# Altium schematic symbol library jlcpcb_2025_04_resistors_extended_2010.schlib: 1697 symbols (part 5 of 9) (continued)
## FRC2010F3R90TS
designator R?  Resistance: 3.9Ω  (hidden comment: *)
Resistor, 3.9Ω, ±1%, 750mW, 200V, ±200ppm/℃, SMD 2010; Manufacturer: Uniroyal; Manufacturer Part Number: FRC2010F3R90TS; Supplier 1: LCSC; Supplier Part Number 1: C3013307; JLCPCB Part Number: C3013307; Power Rating: 750mW; Category: Resistors; Package Size: 2010; JLCPCB Basic Part: Yes; Tolerance: ±1%; Voltage Rating: 200V; Temperature Coefficient: ±200ppm/℃; ComponentLink1Description: Datasheet; ComponentLink1URL: https://wmsc.lcsc.com/wmsc/upload/file/pdf/v2/lcsc/2308241947_FOJAN-FRC2010F3R90TS_C3013307.pdf; ComponentLink2Description: JLCPCB Part URL; ComponentLink2URL: https://jlcpcb.com/partdetail/C3013307
pins: 1, 2
1 alternate drawing of the same symbol

## FRC2010F5R10TS
designator R?  Resistance: 5.1Ω  (hidden comment: *)
Resistor, 5.1Ω, ±1%, SMD 2010; Manufacturer: Uniroyal; Manufacturer Part Number: FRC2010F5R10TS; Supplier 1: LCSC; Supplier Part Number 1: C5121559; JLCPCB Part Number: C5121559; Category: Resistors; Package Size: 2010; JLCPCB Basic Part: Yes; Tolerance: ±1%; ComponentLink1Description: Datasheet; ComponentLink1URL: https://wmsc.lcsc.com/wmsc/upload/file/pdf/v2/lcsc/2308241947_FOJAN-FRC2010F5R10TS_C5121559.pdf; ComponentLink2Description: JLCPCB Part URL; ComponentLink2URL: https://jlcpcb.com/partdetail/C5121559
pins: 1, 2
1 alternate drawing of the same symbol

## FRC2010F5R60TS
designator R?  Resistance: 5.6Ω  (hidden comment: *)
Resistor, 5.6Ω, ±1%, 750mW, 200V, ±200ppm/℃, SMD 2010; Manufacturer: Uniroyal; Manufacturer Part Number: FRC2010F5R60TS; Supplier 1: LCSC; Supplier Part Number 1: C3000667; JLCPCB Part Number: C3000667; Power Rating: 750mW; Category: Resistors; Package Size: 2010; JLCPCB Basic Part: Yes; Tolerance: ±1%; Voltage Rating: 200V; Temperature Coefficient: ±200ppm/℃; ComponentLink1Description: Datasheet; ComponentLink1URL: https://wmsc.lcsc.com/wmsc/upload/file/pdf/v2/lcsc/2308241947_FOJAN-FRC2010F5R60TS_C3000667.pdf; ComponentLink2Description: JLCPCB Part URL; ComponentLink2URL: https://jlcpcb.com/partdetail/C3000667
pins: 1, 2
1 alternate drawing of the same symbol

## FRC2010F7R50TS
designator R?  Resistance: 7.5Ω  (hidden comment: *)
Resistor, 7.5Ω, ±1%, 750mW, 200V, ±200ppm/℃, SMD 2010; Manufacturer: Uniroyal; Manufacturer Part Number: FRC2010F7R50TS; Supplier 1: LCSC; Supplier Part Number 1: C3000555; JLCPCB Part Number: C3000555; Power Rating: 750mW; Category: Resistors; Package Size: 2010; JLCPCB Basic Part: Yes; Tolerance: ±1%; Voltage Rating: 200V; Temperature Coefficient: ±200ppm/℃; ComponentLink1Description: Datasheet; ComponentLink1URL: https://wmsc.lcsc.com/wmsc/upload/file/pdf/v2/lcsc/2308241947_FOJAN-FRC2010F7R50TS_C3000555.pdf; ComponentLink2Description: JLCPCB Part URL; ComponentLink2URL: https://jlcpcb.com/partdetail/C3000555
pins: 1, 2
1 alternate drawing of the same symbol

## FRC2010F10R0TS
designator R?  Resistance: 10Ω  (hidden comment: *)
Resistor, 10Ω, ±1%, 750mW, 200V, ±200ppm/℃, SMD 2010; Manufacturer: Uniroyal; Manufacturer Part Number: FRC2010F10R0TS; Supplier 1: LCSC; Supplier Part Number 1: C2999588; JLCPCB Part Number: C2999588; Power Rating: 750mW; Category: Resistors; Package Size: 2010; JLCPCB Basic Part: Yes; Tolerance: ±1%; Voltage Rating: 200V; Temperature Coefficient: ±200ppm/℃; ComponentLink1Description: Datasheet; ComponentLink1URL: https://wmsc.lcsc.com/wmsc/upload/file/pdf/v2/lcsc/2308241947_FOJAN-FRC2010F10R0TS_C2999588.pdf; ComponentLink2Description: JLCPCB Part URL; ComponentLink2URL: https://jlcpcb.com/partdetail/C2999588
pins: 1, 2
1 alternate drawing of the same symbol

## FRC2010F12R0TS
designator R?  Resistance: 12Ω  (hidden comment: *)
Resistor, 12Ω, ±1%, 750mW, 200V, ±100ppm/℃, SMD 2010; Manufacturer: Uniroyal; Manufacturer Part Number: FRC2010F12R0TS; Supplier 1: LCSC; Supplier Part Number 1: C3013299; JLCPCB Part Number: C3013299; Power Rating: 750mW; Category: Resistors; Package Size: 2010; JLCPCB Basic Part: Yes; Tolerance: ±1%; Voltage Rating: 200V; Temperature Coefficient: ±100ppm/℃; ComponentLink1Description: Datasheet; ComponentLink1URL: https://wmsc.lcsc.com/wmsc/upload/file/pdf/v2/lcsc/2308241947_FOJAN-FRC2010F12R0TS_C3013299.pdf; ComponentLink2Description: JLCPCB Part URL; ComponentLink2URL: https://jlcpcb.com/partdetail/C3013299
pins: 1, 2
1 alternate drawing of the same symbol

## FRC2010F13R0TS
designator R?  Resistance: 13Ω  (hidden comment: *)
Resistor, 13Ω, ±1%, 750mW, 200V, ±100ppm/℃, -55℃~+155℃, SMD 2010; Manufacturer: Uniroyal; Manufacturer Part Number: FRC2010F13R0TS; Supplier 1: LCSC; Supplier Part Number 1: C2974090; JLCPCB Part Number: C2974090; Power Rating: 750mW; Category: Resistors; Package Size: 2010; JLCPCB Basic Part: Yes; Tolerance: ±1%; Voltage Rating: 200V; Temperature Coefficient: ±100ppm/℃; Temperature Rating: -55℃~+155℃; ComponentLink1Description: Datasheet; ComponentLink1URL: https://wmsc.lcsc.com/wmsc/upload/file/pdf/v2/lcsc/2202151130_FOJAN-FRC2010F13R0TS_C2974090.pdf; ComponentLink2Description: JLCPCB Part URL; ComponentLink2URL: https://jlcpcb.com/partdetail/C2974090
pins: 1, 2
1 alternate drawing of the same symbol

## FRC2010F15R0TS
designator R?  Resistance: 15Ω  (hidden comment: *)
Resistor, 15Ω, ±1%, 750mW, 200V, ±100ppm/℃, SMD 2010; Manufacturer: Uniroyal; Manufacturer Part Number: FRC2010F15R0TS; Supplier 1: LCSC; Supplier Part Number 1: C3013300; JLCPCB Part Number: C3013300; Power Rating: 750mW; Category: Resistors; Package Size: 2010; JLCPCB Basic Part: Yes; Tolerance: ±1%; Voltage Rating: 200V; Temperature Coefficient: ±100ppm/℃; ComponentLink1Description: Datasheet; ComponentLink1URL: https://wmsc.lcsc.com/wmsc/upload/file/pdf/v2/lcsc/2308241947_FOJAN-FRC2010F15R0TS_C3013300.pdf; ComponentLink2Description: JLCPCB Part URL; ComponentLink2URL: https://jlcpcb.com/partdetail/C3013300
pins: 1, 2
1 alternate drawing of the same symbol

## FRC2010F22R0TS
designator R?  Resistance: 22Ω  (hidden comment: *)
Resistor, 22Ω, ±1%, 750mW, 200V, ±100ppm/℃, -55℃~+155℃, SMD 2010; Manufacturer: Uniroyal; Manufacturer Part Number: FRC2010F22R0TS; Supplier 1: LCSC; Supplier Part Number 1: C2933985; JLCPCB Part Number: C2933985; Power Rating: 750mW; Category: Resistors; Package Size: 2010; JLCPCB Basic Part: Yes; Tolerance: ±1%; Voltage Rating: 200V; Temperature Coefficient: ±100ppm/℃; Temperature Rating: -55℃~+155℃; ComponentLink1Description: Datasheet; ComponentLink1URL: https://wmsc.lcsc.com/wmsc/upload/file/pdf/v2/lcsc/2308241947_FOJAN-FRC2010F22R0TS_C2933985.pdf; ComponentLink2Description: JLCPCB Part URL; ComponentLink2URL: https://jlcpcb.com/partdetail/C2933985
pins: 1, 2
1 alternate drawing of the same symbol

## FRC2010F33R0TS
designator R?  Resistance: 33Ω  (hidden comment: *)
Resistor, 33Ω, ±1%, 750mW, 200V, ±100ppm/℃, SMD 2010; Manufacturer: Uniroyal; Manufacturer Part Number: FRC2010F33R0TS; Supplier 1: LCSC; Supplier Part Number 1: C3000763; JLCPCB Part Number: C3000763; Power Rating: 750mW; Category: Resistors; Package Size: 2010; JLCPCB Basic Part: Yes; Tolerance: ±1%; Voltage Rating: 200V; Temperature Coefficient: ±100ppm/℃; ComponentLink1Description: Datasheet; ComponentLink1URL: https://wmsc.lcsc.com/wmsc/upload/file/pdf/v2/lcsc/2308241947_FOJAN-FRC2010F33R0TS_C3000763.pdf; ComponentLink2Description: JLCPCB Part URL; ComponentLink2URL: https://jlcpcb.com/partdetail/C3000763
pins: 1, 2
1 alternate drawing of the same symbol

## FRC2010F36R0TS
designator R?  Resistance: 36Ω  (hidden comment: *)
Resistor, 36Ω, ±1%, 750mW, 200V, ±100ppm/℃, -55℃~+155℃, SMD 2010; Manufacturer: Uniroyal; Manufacturer Part Number: FRC2010F36R0TS; Supplier 1: LCSC; Supplier Part Number 1: C2960735; JLCPCB Part Number: C2960735; Power Rating: 750mW; Category: Resistors; Package Size: 2010; JLCPCB Basic Part: Yes; Tolerance: ±1%; Voltage Rating: 200V; Temperature Coefficient: ±100ppm/℃; Temperature Rating: -55℃~+155℃; ComponentLink1Description: Datasheet; ComponentLink1URL: https://wmsc.lcsc.com/wmsc/upload/file/pdf/v2/lcsc/2308241947_FOJAN-FRC2010F36R0TS_C2960735.pdf; ComponentLink2Description: JLCPCB Part URL; ComponentLink2URL: https://jlcpcb.com/partdetail/C2960735
pins: 1, 2
1 alternate drawing of the same symbol

## FRC2010F39R0TS
designator R?  Resistance: 39Ω  (hidden comment: *)
Resistor, 39Ω, ±1%, 750mW, 200V, ±100ppm/℃, SMD 2010; Manufacturer: Uniroyal; Manufacturer Part Number: FRC2010F39R0TS; Supplier 1: LCSC; Supplier Part Number 1: C3013306; JLCPCB Part Number: C3013306; Power Rating: 750mW; Category: Resistors; Package Size: 2010; JLCPCB Basic Part: Yes; Tolerance: ±1%; Voltage Rating: 200V; Temperature Coefficient: ±100ppm/℃; ComponentLink1Description: Datasheet; ComponentLink1URL: https://wmsc.lcsc.com/wmsc/upload/file/pdf/v2/lcsc/2308241947_FOJAN-FRC2010F39R0TS_C3013306.pdf; ComponentLink2Description: JLCPCB Part URL; ComponentLink2URL: https://jlcpcb.com/partdetail/C3013306
pins: 1, 2
1 alternate drawing of the same symbol

## FRC2010F41R2TS
designator R?  Resistance: 41.2Ω  (hidden comment: *)
Resistor, 41.2Ω, ±1%, 750mW, 200V, ±100ppm/℃, SMD 2010; Manufacturer: Uniroyal; Manufacturer Part Number: FRC2010F41R2TS; Supplier 1: LCSC; Supplier Part Number 1: C3013308; JLCPCB Part Number: C3013308; Power Rating: 750mW; Category: Resistors; Package Size: 2010; JLCPCB Basic Part: Yes; Tolerance: ±1%; Voltage Rating: 200V; Temperature Coefficient: ±100ppm/℃; ComponentLink1Description: Datasheet; ComponentLink1URL: https://wmsc.lcsc.com/wmsc/upload/file/pdf/v2/lcsc/2308241947_FOJAN-FRC2010F41R2TS_C3013308.pdf; ComponentLink2Description: JLCPCB Part URL; ComponentLink2URL: https://jlcpcb.com/partdetail/C3013308
pins: 1, 2
1 alternate drawing of the same symbol

## FRC2010F51R0TS
designator R?  Resistance: 51Ω  (hidden comment: *)
Resistor, 51Ω, ±1%, 750mW, 200V, ±100ppm/℃, SMD 2010; Manufacturer: Uniroyal; Manufacturer Part Number: FRC2010F51R0TS; Supplier 1: LCSC; Supplier Part Number 1: C3000766; JLCPCB Part Number: C3000766; Power Rating: 750mW; Category: Resistors; Package Size: 2010; JLCPCB Basic Part: Yes; Tolerance: ±1%; Voltage Rating: 200V; Temperature Coefficient: ±100ppm/℃; ComponentLink1Description: Datasheet; ComponentLink1URL: https://wmsc.lcsc.com/wmsc/upload/file/pdf/v2/lcsc/2308241947_FOJAN-FRC2010F51R0TS_C3000766.pdf; ComponentLink2Description: JLCPCB Part URL; ComponentLink2URL: https://jlcpcb.com/partdetail/C3000766
pins: 1, 2
1 alternate drawing of the same symbol

## FRC2010F62R0TS
designator R?  Resistance: 62Ω  (hidden comment: *)
Resistor, 62Ω, ±1%, 750mW, 200V, ±100ppm/℃, -55℃~+155℃, SMD 2010; Manufacturer: Uniroyal; Manufacturer Part Number: FRC2010F62R0TS; Supplier 1: LCSC; Supplier Part Number 1: C2933990; JLCPCB Part Number: C2933990; Power Rating: 750mW; Category: Resistors; Package Size: 2010; JLCPCB Basic Part: Yes; Tolerance: ±1%; Voltage Rating: 200V; Temperature Coefficient: ±100ppm/℃; Temperature Rating: -55℃~+155℃; ComponentLink1Description: Datasheet; ComponentLink1URL: https://wmsc.lcsc.com/wmsc/upload/file/pdf/v2/lcsc/2308241947_FOJAN-FRC2010F62R0TS_C2933990.pdf; ComponentLink2Description: JLCPCB Part URL; ComponentLink2URL: https://jlcpcb.com/partdetail/C2933990
pins: 1, 2
1 alternate drawing of the same symbol

## FRC2010F63R4TS
designator R?  Resistance: 63.4Ω  (hidden comment: *)
Resistor, 63.4Ω, ±1%, 750mW, 200V, ±100ppm/℃, -55℃~+155℃, SMD 2010; Manufacturer: Uniroyal; Manufacturer Part Number: FRC2010F63R4TS; Supplier 1: LCSC; Supplier Part Number 1: C2933991; JLCPCB Part Number: C2933991; Power Rating: 750mW; Category: Resistors; Package Size: 2010; JLCPCB Basic Part: Yes; Tolerance: ±1%; Voltage Rating: 200V; Temperature Coefficient: ±100ppm/℃; Temperature Rating: -55℃~+155℃; ComponentLink1Description: Datasheet; ComponentLink1URL: https://wmsc.lcsc.com/wmsc/upload/file/pdf/v2/lcsc/2308241947_FOJAN-FRC2010F63R4TS_C2933991.pdf; ComponentLink2Description: JLCPCB Part URL; ComponentLink2URL: https://jlcpcb.com/partdetail/C2933991
pins: 1, 2
1 alternate drawing of the same symbol

## FRC2010F75R0TS
designator R?  Resistance: 75Ω  (hidden comment: *)
Resistor, 75Ω, ±1%, 750mW, 200V, ±100ppm/℃, -55℃~+155℃, SMD 2010; Manufacturer: Uniroyal; Manufacturer Part Number: FRC2010F75R0TS; Supplier 1: LCSC; Supplier Part Number 1: C2933992; JLCPCB Part Number: C2933992; Power Rating: 750mW; Category: Resistors; Package Size: 2010; JLCPCB Basic Part: Yes; Tolerance: ±1%; Voltage Rating: 200V; Temperature Coefficient: ±100ppm/℃; Temperature Rating: -55℃~+155℃; ComponentLink1Description: Datasheet; ComponentLink1URL: https://wmsc.lcsc.com/wmsc/upload/file/pdf/v2/lcsc/2308241947_FOJAN-FRC2010F75R0TS_C2933992.pdf; ComponentLink2Description: JLCPCB Part URL; ComponentLink2URL: https://jlcpcb.com/partdetail/C2933992
pins: 1, 2
1 alternate drawing of the same symbol

## FRC2010F1000TS
designator R?  Resistance: 100Ω  (hidden comment: *)
Resistor, 100Ω, ±1%, 750mW, 200V, ±100ppm/℃, -55℃~+155℃, SMD 2010; Manufacturer: Uniroyal; Manufacturer Part Number: FRC2010F1000TS; Supplier 1: LCSC; Supplier Part Number 1: C2974086; JLCPCB Part Number: C2974086; Power Rating: 750mW; Category: Resistors; Package Size: 2010; JLCPCB Basic Part: Yes; Tolerance: ±1%; Voltage Rating: 200V; Temperature Coefficient: ±100ppm/℃; Temperature Rating: -55℃~+155℃; ComponentLink1Description: Datasheet; ComponentLink1URL: https://wmsc.lcsc.com/wmsc/upload/file/pdf/v2/lcsc/2202151130_FOJAN-FRC2010F1000TS_C2974086.pdf; ComponentLink2Description: JLCPCB Part URL; ComponentLink2URL: https://jlcpcb.com/partdetail/C2974086
pins: 1, 2
1 alternate drawing of the same symbol

## FRC2010F1001TS
designator R?  Resistance: 1kΩ  (hidden comment: *)
Resistor, 1kΩ, ±1%, 750mW, 200V, ±100ppm/℃, -55℃~+155℃, SMD 2010; Manufacturer: Uniroyal; Manufacturer Part Number: FRC2010F1001TS; Supplier 1: LCSC; Supplier Part Number 1: C2974087; JLCPCB Part Number: C2974087; Power Rating: 750mW; Category: Resistors; Package Size: 2010; JLCPCB Basic Part: Yes; Tolerance: ±1%; Voltage Rating: 200V; Temperature Coefficient: ±100ppm/℃; Temperature Rating: -55℃~+155℃; ComponentLink1Description: Datasheet; ComponentLink1URL: https://wmsc.lcsc.com/wmsc/upload/file/pdf/v2/lcsc/2202151130_FOJAN-FRC2010F1001TS_C2974087.pdf; ComponentLink2Description: JLCPCB Part URL; ComponentLink2URL: https://jlcpcb.com/partdetail/C2974087
pins: 1, 2
1 alternate drawing of the same symbol

## FRC2010F1002TS
designator R?  Resistance: 10kΩ  (hidden comment: *)
Resistor, 10kΩ, ±1%, 750mW, 200V, ±100ppm/℃, -55℃~+155℃, SMD 2010; Manufacturer: Uniroyal; Manufacturer Part Number: FRC2010F1002TS; Supplier 1: LCSC; Supplier Part Number 1: C2960917; JLCPCB Part Number: C2960917; Power Rating: 750mW; Category: Resistors; Package Size: 2010; JLCPCB Basic Part: Yes; Tolerance: ±1%; Voltage Rating: 200V; Temperature Coefficient: ±100ppm/℃; Temperature Rating: -55℃~+155℃; ComponentLink1Description: Datasheet; ComponentLink1URL: https://wmsc.lcsc.com/wmsc/upload/file/pdf/v2/lcsc/2308241947_FOJAN-FRC2010F1002TS_C2960917.pdf; ComponentLink2Description: JLCPCB Part URL; ComponentLink2URL: https://jlcpcb.com/partdetail/C2960917
pins: 1, 2
1 alternate drawing of the same symbol

## FRC2010F1003TS
designator R?  Resistance: 100kΩ  (hidden comment: *)
Resistor, 100kΩ, ±1%, 750mW, 200V, ±100ppm/℃, -55℃~+155℃, SMD 2010; Manufacturer: Uniroyal; Manufacturer Part Number: FRC2010F1003TS; Supplier 1: LCSC; Supplier Part Number 1: C2974088; JLCPCB Part Number: C2974088; Power Rating: 750mW; Category: Resistors; Package Size: 2010; JLCPCB Basic Part: Yes; Tolerance: ±1%; Voltage Rating: 200V; Temperature Coefficient: ±100ppm/℃; Temperature Rating: -55℃~+155℃; ComponentLink1Description: Datasheet; ComponentLink1URL: https://wmsc.lcsc.com/wmsc/upload/file/pdf/v2/lcsc/2202151130_FOJAN-FRC2010F1003TS_C2974088.pdf; ComponentLink2Description: JLCPCB Part URL; ComponentLink2URL: https://jlcpcb.com/partdetail/C2974088
pins: 1, 2
1 alternate drawing of the same symbol

## FRC2010F1004TS
designator R?  Resistance: 1MΩ  (hidden comment: *)
Resistor, 1MΩ, ±1%, 750mW, 200V, ±100ppm/℃, -55℃~+155℃, SMD 2010; Manufacturer: Uniroyal; Manufacturer Part Number: FRC2010F1004TS; Supplier 1: LCSC; Supplier Part Number 1: C2933978; JLCPCB Part Number: C2933978; Power Rating: 750mW; Category: Resistors; Package Size: 2010; JLCPCB Basic Part: Yes; Tolerance: ±1%; Voltage Rating: 200V; Temperature Coefficient: ±100ppm/℃; Temperature Rating: -55℃~+155℃; ComponentLink1Description: Datasheet; ComponentLink1URL: https://wmsc.lcsc.com/wmsc/upload/file/pdf/v2/lcsc/2308241947_FOJAN-FRC2010F1004TS_C2933978.pdf; ComponentLink2Description: JLCPCB Part URL; ComponentLink2URL: https://jlcpcb.com/partdetail/C2933978
pins: 1, 2
1 alternate drawing of the same symbol

## FRC2010F1100TS
designator R?  Resistance: 110Ω  (hidden comment: *)
Resistor, 110Ω, ±1%, 750mW, 200V, ±100ppm/℃, -55℃~+155℃, SMD 2010; Manufacturer: Uniroyal; Manufacturer Part Number: FRC2010F1100TS; Supplier 1: LCSC; Supplier Part Number 1: C2960847; JLCPCB Part Number: C2960847; Power Rating: 750mW; Category: Resistors; Package Size: 2010; JLCPCB Basic Part: Yes; Tolerance: ±1%; Voltage Rating: 200V; Temperature Coefficient: ±100ppm/℃; Temperature Rating: -55℃~+155℃; ComponentLink1Description: Datasheet; ComponentLink1URL: https://wmsc.lcsc.com/wmsc/upload/file/pdf/v2/lcsc/2308241947_FOJAN-FRC2010F1100TS_C2960847.pdf; ComponentLink2Description: JLCPCB Part URL; ComponentLink2URL: https://jlcpcb.com/partdetail/C2960847
pins: 1, 2
1 alternate drawing of the same symbol

## FRC2010F1200TS
designator R?  Resistance: 120Ω  (hidden comment: *)
Resistor, 120Ω, ±1%, 750mW, 200V, ±100ppm/℃, -55℃~+155℃, SMD 2010; Manufacturer: Uniroyal; Manufacturer Part Number: FRC2010F1200TS; Supplier 1: LCSC; Supplier Part Number 1: C2974089; JLCPCB Part Number: C2974089; Power Rating: 750mW; Category: Resistors; Package Size: 2010; JLCPCB Basic Part: Yes; Tolerance: ±1%; Voltage Rating: 200V; Temperature Coefficient: ±100ppm/℃; Temperature Rating: -55℃~+155℃; ComponentLink1Description: Datasheet; ComponentLink1URL: https://wmsc.lcsc.com/wmsc/upload/file/pdf/v2/lcsc/2202151130_FOJAN-FRC2010F1200TS_C2974089.pdf; ComponentLink2Description: JLCPCB Part URL; ComponentLink2URL: https://jlcpcb.com/partdetail/C2974089
pins: 1, 2
1 alternate drawing of the same symbol

## FRC2010F1203TS
designator R?  Resistance: 120kΩ  (hidden comment: *)
Resistor, 120kΩ, ±1%, 750mW, 200V, ±100ppm/℃, -55℃~+155℃, SMD 2010; Manufacturer: Uniroyal; Manufacturer Part Number: FRC2010F1203TS; Supplier 1: LCSC; Supplier Part Number 1: C2933979; JLCPCB Part Number: C2933979; Power Rating: 750mW; Category: Resistors; Package Size: 2010; JLCPCB Basic Part: Yes; Tolerance: ±1%; Voltage Rating: 200V; Temperature Coefficient: ±100ppm/℃; Temperature Rating: -55℃~+155℃; ComponentLink1Description: Datasheet; ComponentLink1URL: https://wmsc.lcsc.com/wmsc/upload/file/pdf/v2/lcsc/2308241947_FOJAN-FRC2010F1203TS_C2933979.pdf; ComponentLink2Description: JLCPCB Part URL; ComponentLink2URL: https://jlcpcb.com/partdetail/C2933979
pins: 1, 2
1 alternate drawing of the same symbol

## FRC2010F1301TS
designator R?  Resistance: 1.3kΩ  (hidden comment: *)
Resistor, 1.3kΩ, ±1%, 750mW, 200V, ±100ppm/℃, -55℃~+155℃, SMD 2010; Manufacturer: Uniroyal; Manufacturer Part Number: FRC2010F1301TS; Supplier 1: LCSC; Supplier Part Number 1: C2933981; JLCPCB Part Number: C2933981; Power Rating: 750mW; Category: Resistors; Package Size: 2010; JLCPCB Basic Part: Yes; Tolerance: ±1%; Voltage Rating: 200V; Temperature Coefficient: ±100ppm/℃; Temperature Rating: -55℃~+155℃; ComponentLink1Description: Datasheet; ComponentLink1URL: https://wmsc.lcsc.com/wmsc/upload/file/pdf/v2/lcsc/2308241947_FOJAN-FRC2010F1301TS_C2933981.pdf; ComponentLink2Description: JLCPCB Part URL; ComponentLink2URL: https://jlcpcb.com/partdetail/C2933981
pins: 1, 2
1 alternate drawing of the same symbol

## FRC2010F1500TS
designator R?  Resistance: 150Ω  (hidden comment: *)
Resistor, 150Ω, ±1%, 750mW, 200V, ±100ppm/℃, -55℃~+155℃, SMD 2010; Manufacturer: Uniroyal; Manufacturer Part Number: FRC2010F1500TS; Supplier 1: LCSC; Supplier Part Number 1: C2933982; JLCPCB Part Number: C2933982; Power Rating: 750mW; Category: Resistors; Package Size: 2010; JLCPCB Basic Part: Yes; Tolerance: ±1%; Voltage Rating: 200V; Temperature Coefficient: ±100ppm/℃; Temperature Rating: -55℃~+155℃; ComponentLink1Description: Datasheet; ComponentLink1URL: https://wmsc.lcsc.com/wmsc/upload/file/pdf/v2/lcsc/2308241947_FOJAN-FRC2010F1500TS_C2933982.pdf; ComponentLink2Description: JLCPCB Part URL; ComponentLink2URL: https://jlcpcb.com/partdetail/C2933982
pins: 1, 2
1 alternate drawing of the same symbol

## FRC2010F1501TS
designator R?  Resistance: 1.5kΩ  (hidden comment: *)
Resistor, 1.5kΩ, ±1%, 750mW, 200V, ±100ppm/℃, -55℃~+155℃, SMD 2010; Manufacturer: Uniroyal; Manufacturer Part Number: FRC2010F1501TS; Supplier 1: LCSC; Supplier Part Number 1: C2974091; JLCPCB Part Number: C2974091; Power Rating: 750mW; Category: Resistors; Package Size: 2010; JLCPCB Basic Part: Yes; Tolerance: ±1%; Voltage Rating: 200V; Temperature Coefficient: ±100ppm/℃; Temperature Rating: -55℃~+155℃; ComponentLink1Description: Datasheet; ComponentLink1URL: https://wmsc.lcsc.com/wmsc/upload/file/pdf/v2/lcsc/2202151130_FOJAN-FRC2010F1501TS_C2974091.pdf; ComponentLink2Description: JLCPCB Part URL; ComponentLink2URL: https://jlcpcb.com/partdetail/C2974091
pins: 1, 2
1 alternate drawing of the same symbol

## FRC2010F1503TS
designator R?  Resistance: 150kΩ  (hidden comment: *)
Resistor, 150kΩ, ±1%, 750mW, 200V, ±100ppm/℃, -55℃~+155℃, SMD 2010; Manufacturer: Uniroyal; Manufacturer Part Number: FRC2010F1503TS; Supplier 1: LCSC; Supplier Part Number 1: C2933983; JLCPCB Part Number: C2933983; Power Rating: 750mW; Category: Resistors; Package Size: 2010; JLCPCB Basic Part: Yes; Tolerance: ±1%; Voltage Rating: 200V; Temperature Coefficient: ±100ppm/℃; Temperature Rating: -55℃~+155℃; ComponentLink1Description: Datasheet; ComponentLink1URL: https://wmsc.lcsc.com/wmsc/upload/file/pdf/v2/lcsc/2308241947_FOJAN-FRC2010F1503TS_C2933983.pdf; ComponentLink2Description: JLCPCB Part URL; ComponentLink2URL: https://jlcpcb.com/partdetail/C2933983
pins: 1, 2
1 alternate drawing of the same symbol

## FRC2010F1802TS
designator R?  Resistance: 18kΩ  (hidden comment: *)
Resistor, 18kΩ, ±1%, 750mW, 200V, ±100ppm/℃, SMD 2010; Manufacturer: Uniroyal; Manufacturer Part Number: FRC2010F1802TS; Supplier 1: LCSC; Supplier Part Number 1: C2999522; JLCPCB Part Number: C2999522; Power Rating: 750mW; Category: Resistors; Package Size: 2010; JLCPCB Basic Part: Yes; Tolerance: ±1%; Voltage Rating: 200V; Temperature Coefficient: ±100ppm/℃; ComponentLink1Description: Datasheet; ComponentLink1URL: https://wmsc.lcsc.com/wmsc/upload/file/pdf/v2/lcsc/2308241947_FOJAN-FRC2010F1802TS_C2999522.pdf; ComponentLink2Description: JLCPCB Part URL; ComponentLink2URL: https://jlcpcb.com/partdetail/C2999522
pins: 1, 2
1 alternate drawing of the same symbol

## FRC2010F2000TS
designator R?  Resistance: 200Ω  (hidden comment: *)
Resistor, 200Ω, ±1%, 750mW, 200V, ±100ppm/℃, -55℃~+155℃, SMD 2010; Manufacturer: Uniroyal; Manufacturer Part Number: FRC2010F2000TS; Supplier 1: LCSC; Supplier Part Number 1: C2974095; JLCPCB Part Number: C2974095; Power Rating: 750mW; Category: Resistors; Package Size: 2010; JLCPCB Basic Part: Yes; Tolerance: ±1%; Voltage Rating: 200V; Temperature Coefficient: ±100ppm/℃; Temperature Rating: -55℃~+155℃; ComponentLink1Description: Datasheet; ComponentLink1URL: https://wmsc.lcsc.com/wmsc/upload/file/pdf/v2/lcsc/2202151130_FOJAN-FRC2010F2000TS_C2974095.pdf; ComponentLink2Description: JLCPCB Part URL; ComponentLink2URL: https://jlcpcb.com/partdetail/C2974095
pins: 1, 2
1 alternate drawing of the same symbol

## FRC2010F2001TS
designator R?  Resistance: 2kΩ  (hidden comment: *)
Resistor, 2kΩ, ±1%, 750mW, 200V, ±100ppm/℃, -55℃~+155℃, SMD 2010; Manufacturer: Uniroyal; Manufacturer Part Number: FRC2010F2001TS; Supplier 1: LCSC; Supplier Part Number 1: C2974096; JLCPCB Part Number: C2974096; Power Rating: 750mW; Category: Resistors; Package Size: 2010; JLCPCB Basic Part: Yes; Tolerance: ±1%; Voltage Rating: 200V; Temperature Coefficient: ±100ppm/℃; Temperature Rating: -55℃~+155℃; ComponentLink1Description: Datasheet; ComponentLink1URL: https://wmsc.lcsc.com/wmsc/upload/file/pdf/v2/lcsc/2202151130_FOJAN-FRC2010F2001TS_C2974096.pdf; ComponentLink2Description: JLCPCB Part URL; ComponentLink2URL: https://jlcpcb.com/partdetail/C2974096
pins: 1, 2
1 alternate drawing of the same symbol

## FRC2010F2003TS
designator R?  Resistance: 200kΩ  (hidden comment: *)
Resistor, 200kΩ, ±1%, 750mW, 200V, ±100ppm/℃, -55℃~+155℃, SMD 2010; Manufacturer: Uniroyal; Manufacturer Part Number: FRC2010F2003TS; Supplier 1: LCSC; Supplier Part Number 1: C2933984; JLCPCB Part Number: C2933984; Power Rating: 750mW; Category: Resistors; Package Size: 2010; JLCPCB Basic Part: Yes; Tolerance: ±1%; Voltage Rating: 200V; Temperature Coefficient: ±100ppm/℃; Temperature Rating: -55℃~+155℃; ComponentLink1Description: Datasheet; ComponentLink1URL: https://wmsc.lcsc.com/wmsc/upload/file/pdf/v2/lcsc/2308241947_FOJAN-FRC2010F2003TS_C2933984.pdf; ComponentLink2Description: JLCPCB Part URL; ComponentLink2URL: https://jlcpcb.com/partdetail/C2933984
pins: 1, 2
1 alternate drawing of the same symbol

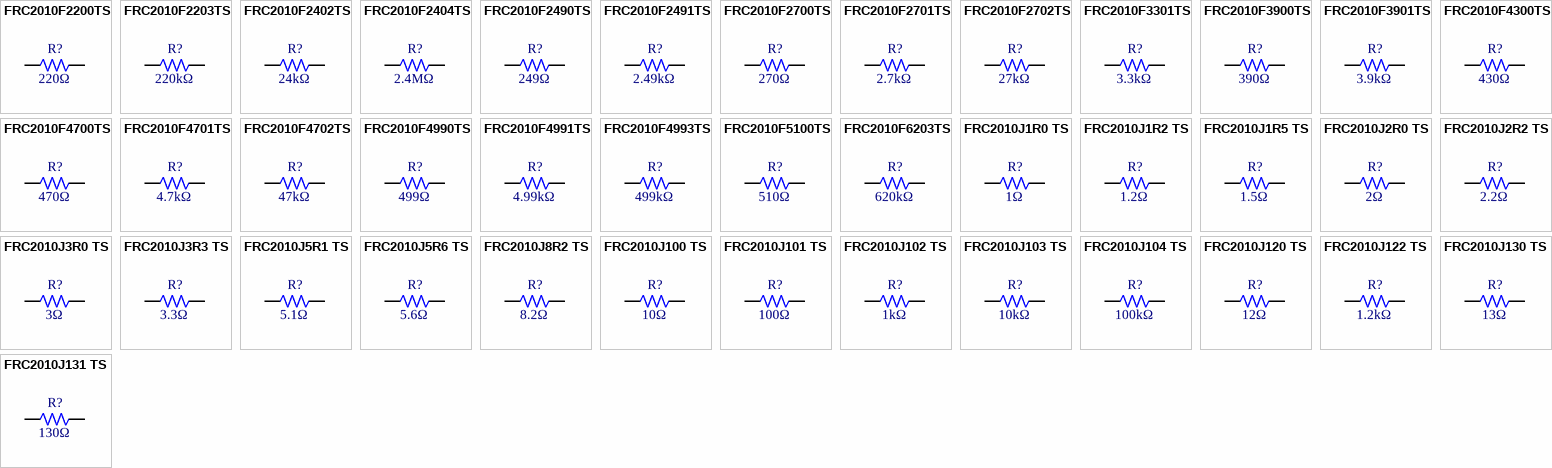
[diagram p24: symbols FRC2010F2200TS to FRC2010J131 TS]

## FRC2010F2200TS
designator R?  Resistance: 220Ω  (hidden comment: *)
Resistor, 220Ω, ±1%, 750mW, 200V, ±100ppm/℃, -55℃~+155℃, SMD 2010; Manufacturer: Uniroyal; Manufacturer Part Number: FRC2010F2200TS; Supplier 1: LCSC; Supplier Part Number 1: C2974097; JLCPCB Part Number: C2974097; Power Rating: 750mW; Category: Resistors; Package Size: 2010; JLCPCB Basic Part: Yes; Tolerance: ±1%; Voltage Rating: 200V; Temperature Coefficient: ±100ppm/℃; Temperature Rating: -55℃~+155℃; ComponentLink1Description: Datasheet; ComponentLink1URL: https://wmsc.lcsc.com/wmsc/upload/file/pdf/v2/lcsc/2202151130_FOJAN-FRC2010F2200TS_C2974097.pdf; ComponentLink2Description: JLCPCB Part URL; ComponentLink2URL: https://jlcpcb.com/partdetail/C2974097
pins: 1, 2
1 alternate drawing of the same symbol

## FRC2010F2203TS
designator R?  Resistance: 220kΩ  (hidden comment: *)
Resistor, 220kΩ, ±1%, 750mW, 200V, ±100ppm/℃, -55℃~+155℃, SMD 2010; Manufacturer: Uniroyal; Manufacturer Part Number: FRC2010F2203TS; Supplier 1: LCSC; Supplier Part Number 1: C2960813; JLCPCB Part Number: C2960813; Power Rating: 750mW; Category: Resistors; Package Size: 2010; JLCPCB Basic Part: Yes; Tolerance: ±1%; Voltage Rating: 200V; Temperature Coefficient: ±100ppm/℃; Temperature Rating: -55℃~+155℃; ComponentLink1Description: Datasheet; ComponentLink1URL: https://wmsc.lcsc.com/wmsc/upload/file/pdf/v2/lcsc/2308241947_FOJAN-FRC2010F2203TS_C2960813.pdf; ComponentLink2Description: JLCPCB Part URL; ComponentLink2URL: https://jlcpcb.com/partdetail/C2960813
pins: 1, 2
1 alternate drawing of the same symbol

## FRC2010F2402TS
designator R?  Resistance: 24kΩ  (hidden comment: *)
Resistor, 24kΩ, ±1%, 750mW, 200V, ±100ppm/℃, SMD 2010; Manufacturer: Uniroyal; Manufacturer Part Number: FRC2010F2402TS; Supplier 1: LCSC; Supplier Part Number 1: C3000549; JLCPCB Part Number: C3000549; Power Rating: 750mW; Category: Resistors; Package Size: 2010; JLCPCB Basic Part: Yes; Tolerance: ±1%; Voltage Rating: 200V; Temperature Coefficient: ±100ppm/℃; ComponentLink1Description: Datasheet; ComponentLink1URL: https://wmsc.lcsc.com/wmsc/upload/file/pdf/v2/lcsc/2308241947_FOJAN-FRC2010F2402TS_C3000549.pdf; ComponentLink2Description: JLCPCB Part URL; ComponentLink2URL: https://jlcpcb.com/partdetail/C3000549
pins: 1, 2
1 alternate drawing of the same symbol

## FRC2010F2404TS
designator R?  Resistance: 2.4MΩ  (hidden comment: *)
Resistor, 2.4MΩ, ±1%, 750mW, 200V, ±100ppm/℃, -55℃~+155℃, SMD 2010; Manufacturer: Uniroyal; Manufacturer Part Number: FRC2010F2404TS; Supplier 1: LCSC; Supplier Part Number 1: C2933986; JLCPCB Part Number: C2933986; Power Rating: 750mW; Category: Resistors; Package Size: 2010; JLCPCB Basic Part: Yes; Tolerance: ±1%; Voltage Rating: 200V; Temperature Coefficient: ±100ppm/℃; Temperature Rating: -55℃~+155℃; ComponentLink1Description: Datasheet; ComponentLink1URL: https://wmsc.lcsc.com/wmsc/upload/file/pdf/v2/lcsc/2308241947_FOJAN-FRC2010F2404TS_C2933986.pdf; ComponentLink2Description: JLCPCB Part URL; ComponentLink2URL: https://jlcpcb.com/partdetail/C2933986
pins: 1, 2
1 alternate drawing of the same symbol

## FRC2010F2490TS
designator R?  Resistance: 249Ω  (hidden comment: *)
Resistor, 249Ω, ±1%, 750mW, 200V, ±100ppm/℃, SMD 2010; Manufacturer: Uniroyal; Manufacturer Part Number: FRC2010F2490TS; Supplier 1: LCSC; Supplier Part Number 1: C2999587; JLCPCB Part Number: C2999587; Power Rating: 750mW; Category: Resistors; Package Size: 2010; JLCPCB Basic Part: Yes; Tolerance: ±1%; Voltage Rating: 200V; Temperature Coefficient: ±100ppm/℃; ComponentLink1Description: Datasheet; ComponentLink1URL: https://wmsc.lcsc.com/wmsc/upload/file/pdf/v2/lcsc/2308241947_FOJAN-FRC2010F2490TS_C2999587.pdf; ComponentLink2Description: JLCPCB Part URL; ComponentLink2URL: https://jlcpcb.com/partdetail/C2999587
pins: 1, 2
1 alternate drawing of the same symbol

## FRC2010F2491TS
designator R?  Resistance: 2.49kΩ  (hidden comment: *)
Resistor, 2.49kΩ, ±1%, 750mW, 200V, ±100ppm/℃, SMD 2010; Manufacturer: Uniroyal; Manufacturer Part Number: FRC2010F2491TS; Supplier 1: LCSC; Supplier Part Number 1: C5713367; JLCPCB Part Number: C5713367; Power Rating: 750mW; Category: Resistors; Package Size: 2010; JLCPCB Basic Part: Yes; Tolerance: ±1%; Voltage Rating: 200V; Temperature Coefficient: ±100ppm/℃; ComponentLink1Description: Datasheet; ComponentLink1URL: https://wmsc.lcsc.com/wmsc/upload/file/pdf/v2/lcsc/2308241947_FOJAN-FRC2010F2491TS_C5713367.pdf; ComponentLink2Description: JLCPCB Part URL; ComponentLink2URL: https://jlcpcb.com/partdetail/C5713367
pins: 1, 2
1 alternate drawing of the same symbol

## FRC2010F2700TS
designator R?  Resistance: 270Ω  (hidden comment: *)
Resistor, 270Ω, ±1%, 750mW, 200V, ±100ppm/℃, -55℃~+155℃, SMD 2010; Manufacturer: Uniroyal; Manufacturer Part Number: FRC2010F2700TS; Supplier 1: LCSC; Supplier Part Number 1: C2960894; JLCPCB Part Number: C2960894; Power Rating: 750mW; Category: Resistors; Package Size: 2010; JLCPCB Basic Part: Yes; Tolerance: ±1%; Voltage Rating: 200V; Temperature Coefficient: ±100ppm/℃; Temperature Rating: -55℃~+155℃; ComponentLink1Description: Datasheet; ComponentLink1URL: https://wmsc.lcsc.com/wmsc/upload/file/pdf/v2/lcsc/2308241947_FOJAN-FRC2010F2700TS_C2960894.pdf; ComponentLink2Description: JLCPCB Part URL; ComponentLink2URL: https://jlcpcb.com/partdetail/C2960894
pins: 1, 2
1 alternate drawing of the same symbol

## FRC2010F2701TS
designator R?  Resistance: 2.7kΩ  (hidden comment: *)
Resistor, 2.7kΩ, ±1%, 750mW, 200V, ±100ppm/℃, -55℃~+155℃, SMD 2010; Manufacturer: Uniroyal; Manufacturer Part Number: FRC2010F2701TS; Supplier 1: LCSC; Supplier Part Number 1: C2974099; JLCPCB Part Number: C2974099; Power Rating: 750mW; Category: Resistors; Package Size: 2010; JLCPCB Basic Part: Yes; Tolerance: ±1%; Voltage Rating: 200V; Temperature Coefficient: ±100ppm/℃; Temperature Rating: -55℃~+155℃; ComponentLink1Description: Datasheet; ComponentLink1URL: https://wmsc.lcsc.com/wmsc/upload/file/pdf/v2/lcsc/2202151130_FOJAN-FRC2010F2701TS_C2974099.pdf; ComponentLink2Description: JLCPCB Part URL; ComponentLink2URL: https://jlcpcb.com/partdetail/C2974099
pins: 1, 2
1 alternate drawing of the same symbol

## FRC2010F2702TS
designator R?  Resistance: 27kΩ  (hidden comment: *)
Resistor, 27kΩ, ±1%, 750mW, 200V, ±100ppm/℃, SMD 2010; Manufacturer: Uniroyal; Manufacturer Part Number: FRC2010F2702TS; Supplier 1: LCSC; Supplier Part Number 1: C3000762; JLCPCB Part Number: C3000762; Power Rating: 750mW; Category: Resistors; Package Size: 2010; JLCPCB Basic Part: Yes; Tolerance: ±1%; Voltage Rating: 200V; Temperature Coefficient: ±100ppm/℃; ComponentLink1Description: Datasheet; ComponentLink1URL: https://wmsc.lcsc.com/wmsc/upload/file/pdf/v2/lcsc/2308241947_FOJAN-FRC2010F2702TS_C3000762.pdf; ComponentLink2Description: JLCPCB Part URL; ComponentLink2URL: https://jlcpcb.com/partdetail/C3000762
pins: 1, 2
1 alternate drawing of the same symbol

## FRC2010F3301TS
designator R?  Resistance: 3.3kΩ  (hidden comment: *)
Resistor, 3.3kΩ, ±1%, 750mW, 200V, ±100ppm/℃, SMD 2010; Manufacturer: Uniroyal; Manufacturer Part Number: FRC2010F3301TS; Supplier 1: LCSC; Supplier Part Number 1: C3000595; JLCPCB Part Number: C3000595; Power Rating: 750mW; Category: Resistors; Package Size: 2010; JLCPCB Basic Part: Yes; Tolerance: ±1%; Voltage Rating: 200V; Temperature Coefficient: ±100ppm/℃; ComponentLink1Description: Datasheet; ComponentLink1URL: https://wmsc.lcsc.com/wmsc/upload/file/pdf/v2/lcsc/2308241947_FOJAN-FRC2010F3301TS_C3000595.pdf; ComponentLink2Description: JLCPCB Part URL; ComponentLink2URL: https://jlcpcb.com/partdetail/C3000595
pins: 1, 2
1 alternate drawing of the same symbol

## FRC2010F3900TS
designator R?  Resistance: 390Ω  (hidden comment: *)
Resistor, 390Ω, ±1%, 750mW, 200V, ±100ppm/℃, SMD 2010; Manufacturer: Uniroyal; Manufacturer Part Number: FRC2010F3900TS; Supplier 1: LCSC; Supplier Part Number 1: C3013304; JLCPCB Part Number: C3013304; Power Rating: 750mW; Category: Resistors; Package Size: 2010; JLCPCB Basic Part: Yes; Tolerance: ±1%; Voltage Rating: 200V; Temperature Coefficient: ±100ppm/℃; ComponentLink1Description: Datasheet; ComponentLink1URL: https://wmsc.lcsc.com/wmsc/upload/file/pdf/v2/lcsc/2308241947_FOJAN-FRC2010F3900TS_C3013304.pdf; ComponentLink2Description: JLCPCB Part URL; ComponentLink2URL: https://jlcpcb.com/partdetail/C3013304
pins: 1, 2
1 alternate drawing of the same symbol

## FRC2010F3901TS
designator R?  Resistance: 3.9kΩ  (hidden comment: *)
Resistor, 3.9kΩ, ±1%, 750mW, 200V, ±100ppm/℃, SMD 2010; Manufacturer: Uniroyal; Manufacturer Part Number: FRC2010F3901TS; Supplier 1: LCSC; Supplier Part Number 1: C3013305; JLCPCB Part Number: C3013305; Power Rating: 750mW; Category: Resistors; Package Size: 2010; JLCPCB Basic Part: Yes; Tolerance: ±1%; Voltage Rating: 200V; Temperature Coefficient: ±100ppm/℃; ComponentLink1Description: Datasheet; ComponentLink1URL: https://wmsc.lcsc.com/wmsc/upload/file/pdf/v2/lcsc/2308241947_FOJAN-FRC2010F3901TS_C3013305.pdf; ComponentLink2Description: JLCPCB Part URL; ComponentLink2URL: https://jlcpcb.com/partdetail/C3013305
pins: 1, 2
1 alternate drawing of the same symbol

## FRC2010F4300TS
designator R?  Resistance: 430Ω  (hidden comment: *)
Resistor, 430Ω, ±1%, 750mW, 200V, ±100ppm/℃, -55℃~+155℃, SMD 2010; Manufacturer: Uniroyal; Manufacturer Part Number: FRC2010F4300TS; Supplier 1: LCSC; Supplier Part Number 1: C2933988; JLCPCB Part Number: C2933988; Power Rating: 750mW; Category: Resistors; Package Size: 2010; JLCPCB Basic Part: Yes; Tolerance: ±1%; Voltage Rating: 200V; Temperature Coefficient: ±100ppm/℃; Temperature Rating: -55℃~+155℃; ComponentLink1Description: Datasheet; ComponentLink1URL: https://wmsc.lcsc.com/wmsc/upload/file/pdf/v2/lcsc/2308241947_FOJAN-FRC2010F4300TS_C2933988.pdf; ComponentLink2Description: JLCPCB Part URL; ComponentLink2URL: https://jlcpcb.com/partdetail/C2933988
pins: 1, 2
1 alternate drawing of the same symbol

## FRC2010F4700TS
designator R?  Resistance: 470Ω  (hidden comment: *)
Resistor, 470Ω, ±1%, 750mW, 200V, ±100ppm/℃, -55℃~+155℃, SMD 2010; Manufacturer: Uniroyal; Manufacturer Part Number: FRC2010F4700TS; Supplier 1: LCSC; Supplier Part Number 1: C2933989; JLCPCB Part Number: C2933989; Power Rating: 750mW; Category: Resistors; Package Size: 2010; JLCPCB Basic Part: Yes; Tolerance: ±1%; Voltage Rating: 200V; Temperature Coefficient: ±100ppm/℃; Temperature Rating: -55℃~+155℃; ComponentLink1Description: Datasheet; ComponentLink1URL: https://wmsc.lcsc.com/wmsc/upload/file/pdf/v2/lcsc/2308241947_FOJAN-FRC2010F4700TS_C2933989.pdf; ComponentLink2Description: JLCPCB Part URL; ComponentLink2URL: https://jlcpcb.com/partdetail/C2933989
pins: 1, 2
1 alternate drawing of the same symbol

## FRC2010F4701TS
designator R?  Resistance: 4.7kΩ  (hidden comment: *)
Resistor, 4.7kΩ, ±1%, 750mW, 200V, ±100ppm/℃, SMD 2010; Manufacturer: Uniroyal; Manufacturer Part Number: FRC2010F4701TS; Supplier 1: LCSC; Supplier Part Number 1: C2999598; JLCPCB Part Number: C2999598; Power Rating: 750mW; Category: Resistors; Package Size: 2010; JLCPCB Basic Part: Yes; Tolerance: ±1%; Voltage Rating: 200V; Temperature Coefficient: ±100ppm/℃; ComponentLink1Description: Datasheet; ComponentLink1URL: https://wmsc.lcsc.com/wmsc/upload/file/pdf/v2/lcsc/2308241947_FOJAN-FRC2010F4701TS_C2999598.pdf; ComponentLink2Description: JLCPCB Part URL; ComponentLink2URL: https://jlcpcb.com/partdetail/C2999598
pins: 1, 2
1 alternate drawing of the same symbol

## FRC2010F4702TS
designator R?  Resistance: 47kΩ  (hidden comment: *)
Resistor, 47kΩ, ±1%, 750mW, 200V, ±100ppm/℃, SMD 2010; Manufacturer: Uniroyal; Manufacturer Part Number: FRC2010F4702TS; Supplier 1: LCSC; Supplier Part Number 1: C3000551; JLCPCB Part Number: C3000551; Power Rating: 750mW; Category: Resistors; Package Size: 2010; JLCPCB Basic Part: Yes; Tolerance: ±1%; Voltage Rating: 200V; Temperature Coefficient: ±100ppm/℃; ComponentLink1Description: Datasheet; ComponentLink1URL: https://wmsc.lcsc.com/wmsc/upload/file/pdf/v2/lcsc/2308241947_FOJAN-FRC2010F4702TS_C3000551.pdf; ComponentLink2Description: JLCPCB Part URL; ComponentLink2URL: https://jlcpcb.com/partdetail/C3000551
pins: 1, 2
1 alternate drawing of the same symbol

## FRC2010F4990TS
designator R?  Resistance: 499Ω  (hidden comment: *)
Resistor, 499Ω, ±1%, 750mW, 200V, ±100ppm/℃, SMD 2010; Manufacturer: Uniroyal; Manufacturer Part Number: FRC2010F4990TS; Supplier 1: LCSC; Supplier Part Number 1: C3000554; JLCPCB Part Number: C3000554; Power Rating: 750mW; Category: Resistors; Package Size: 2010; JLCPCB Basic Part: Yes; Tolerance: ±1%; Voltage Rating: 200V; Temperature Coefficient: ±100ppm/℃; ComponentLink1Description: Datasheet; ComponentLink1URL: https://wmsc.lcsc.com/wmsc/upload/file/pdf/v2/lcsc/2308241947_FOJAN-FRC2010F4990TS_C3000554.pdf; ComponentLink2Description: JLCPCB Part URL; ComponentLink2URL: https://jlcpcb.com/partdetail/C3000554
pins: 1, 2
1 alternate drawing of the same symbol

## FRC2010F4991TS
designator R?  Resistance: 4.99kΩ  (hidden comment: *)
Resistor, 4.99kΩ, ±1%, 750mW, 200V, ±100ppm/℃, SMD 2010; Manufacturer: Uniroyal; Manufacturer Part Number: FRC2010F4991TS; Supplier 1: LCSC; Supplier Part Number 1: C2999617; JLCPCB Part Number: C2999617; Power Rating: 750mW; Category: Resistors; Package Size: 2010; JLCPCB Basic Part: Yes; Tolerance: ±1%; Voltage Rating: 200V; Temperature Coefficient: ±100ppm/℃; ComponentLink1Description: Datasheet; ComponentLink1URL: https://wmsc.lcsc.com/wmsc/upload/file/pdf/v2/lcsc/2308241947_FOJAN-FRC2010F4991TS_C2999617.pdf; ComponentLink2Description: JLCPCB Part URL; ComponentLink2URL: https://jlcpcb.com/partdetail/C2999617
pins: 1, 2
1 alternate drawing of the same symbol

## FRC2010F4993TS
designator R?  Resistance: 499kΩ  (hidden comment: *)
Resistor, 499kΩ, ±1%, 750mW, 200V, ±100ppm/℃, SMD 2010; Manufacturer: Uniroyal; Manufacturer Part Number: FRC2010F4993TS; Supplier 1: LCSC; Supplier Part Number 1: C5713370; JLCPCB Part Number: C5713370; Power Rating: 750mW; Category: Resistors; Package Size: 2010; JLCPCB Basic Part: Yes; Tolerance: ±1%; Voltage Rating: 200V; Temperature Coefficient: ±100ppm/℃; ComponentLink1Description: Datasheet; ComponentLink1URL: https://wmsc.lcsc.com/wmsc/upload/file/pdf/v2/lcsc/2308241947_FOJAN-FRC2010F4993TS_C5713370.pdf; ComponentLink2Description: JLCPCB Part URL; ComponentLink2URL: https://jlcpcb.com/partdetail/C5713370
pins: 1, 2
1 alternate drawing of the same symbol